# Altium schematic symbol library jlcpcb_2025_04_capacitors_extended_0402.schlib: 3594 symbols (part 6 of 20) (continued)
## C1005X5R0J225MTJ00F
designator C?  Capacitance: 2.2uF  (hidden comment: *)
Capacitor, Ceramic (MLCC), 2.2uF, ±20%, 6.3V, X5R, ±20%, SMD 0402; Manufacturer: TDK; Manufacturer Part Number: C1005X5R0J225MTJ00F; Package Size: 0402; JLCPCB Basic Part: No; JLCPCB Part Number: C343037; Supplier 1: LCSC; Category: Capacitors - MLCC; Supplier Part Number 1: C343037; Tolerance: ±20%; Voltage Rating: 6.3V; Temperature Coefficient: X5R; RoHS: Yes; ComponentLink1Description: Datasheet; ComponentLink1URL: https://wmsc.lcsc.com/wmsc/upload/file/pdf/v2/lcsc/2304140030_TDK-C1005X5R0J225MTJ00F_C343037.pdf; ComponentLink2Description: JLCPCB Part URL; ComponentLink2URL: https://jlcpcb.com/partdetail/C343037; ComponentLink3Description: LCSC Part URL; ComponentLink3URL: https://lcsc.com/product-detail/Multilayer-Ceramic-Capacitors-MLCC---SMD-SMT_TDK-TDK-C1005X5R0J225MTJ00F_C343037.html
footprint CAP-0402 (0402 (1005M) Capacitor)
pins: 1, 2

## C1005X5R0J335MTJ00E
designator C?  Capacitance: 3.3uF  (hidden comment: *)
Capacitor, Ceramic (MLCC), 3.3uF, ±20%, 6.3V, X5R, ±20%, SMD 0402; Manufacturer: TDK; Manufacturer Part Number: C1005X5R0J335MTJ00E; Package Size: 0402; JLCPCB Basic Part: No; JLCPCB Part Number: C694161; Supplier 1: LCSC; Category: Capacitors - MLCC; Supplier Part Number 1: C694161; Tolerance: ±20%; Voltage Rating: 6.3V; Temperature Coefficient: X5R; RoHS: Yes; ComponentLink1Description: Datasheet; ComponentLink1URL: https://wmsc.lcsc.com/wmsc/upload/file/pdf/v2/lcsc/2304140030_TDK-C1005X5R0J335MTJ00E_C694161.pdf; ComponentLink2Description: JLCPCB Part URL; ComponentLink2URL: https://jlcpcb.com/partdetail/C694161; ComponentLink3Description: LCSC Part URL; ComponentLink3URL: https://lcsc.com/product-detail/Multilayer-Ceramic-Capacitors-MLCC---SMD-SMT_TDK-TDK-C1005X5R0J335MTJ00E_C694161.html
footprint CAP-0402 (0402 (1005M) Capacitor)
pins: 1, 2

## C1005X5R0J475KTJ00F
designator C?  Capacitance: 4.7uF  (hidden comment: *)
Capacitor, Ceramic (MLCC), 4.7uF, ±10%, 6.3V, X5R, ±10%, SMD 0402; Manufacturer: TDK; Manufacturer Part Number: C1005X5R0J475KTJ00F; Package Size: 0402; JLCPCB Basic Part: No; JLCPCB Part Number: C342989; Supplier 1: LCSC; Category: Capacitors - MLCC; Supplier Part Number 1: C342989; Tolerance: ±10%; Voltage Rating: 6.3V; Temperature Coefficient: X5R; RoHS: Yes; ComponentLink1Description: Datasheet; ComponentLink1URL: https://wmsc.lcsc.com/wmsc/upload/file/pdf/v2/lcsc/2304140030_TDK-C1005X5R0J475KTJ00F_C342989.pdf; ComponentLink2Description: JLCPCB Part URL; ComponentLink2URL: https://jlcpcb.com/partdetail/C342989; ComponentLink3Description: LCSC Part URL; ComponentLink3URL: https://lcsc.com/product-detail/Multilayer-Ceramic-Capacitors-MLCC---SMD-SMT_TDK-TDK-C1005X5R0J475KTJ00F_C342989.html
footprint CAP-0402 (0402 (1005M) Capacitor)
pins: 1, 2

## C1005X5R0J475MTJ00E
designator C?  Capacitance: 4.7uF  (hidden comment: *)
Capacitor, Ceramic (MLCC), 4.7uF, ±20%, 6.3V, X5R, ±20%, SMD 0402; Manufacturer: TDK; Manufacturer Part Number: C1005X5R0J475MTJ00E; Package Size: 0402; JLCPCB Basic Part: No; JLCPCB Part Number: C23687; Supplier 1: LCSC; Category: Capacitors - MLCC; Supplier Part Number 1: C23687; Tolerance: ±20%; Voltage Rating: 6.3V; Temperature Coefficient: X5R; RoHS: Yes; ComponentLink1Description: Datasheet; ComponentLink1URL: https://wmsc.lcsc.com/wmsc/upload/file/pdf/v2/lcsc/1809051323_TDK-C1005X5R0J475MTJ00E_C23687.pdf; ComponentLink2Description: JLCPCB Part URL; ComponentLink2URL: https://jlcpcb.com/partdetail/C23687; ComponentLink3Description: LCSC Part URL; ComponentLink3URL: https://lcsc.com/product-detail/Multilayer-Ceramic-Capacitors-MLCC---SMD-SMT_TDK-TDK-C1005X5R0J475MTJ00E_C23687.html
footprint CAP-0402 (0402 (1005M) Capacitor)
pins: 1, 2

## C1005X5R1A105KTJ00F
designator C?  Capacitance: 1uF  (hidden comment: *)
Capacitor, Ceramic (MLCC), 1uF, ±10%, 10V, X5R, ±10%, SMD 0402; Manufacturer: TDK; Manufacturer Part Number: C1005X5R1A105KTJ00F; Package Size: 0402; JLCPCB Basic Part: No; JLCPCB Part Number: C694162; Supplier 1: LCSC; Category: Capacitors - MLCC; Supplier Part Number 1: C694162; Tolerance: ±10%; Voltage Rating: 10V; Temperature Coefficient: X5R; RoHS: Yes; ComponentLink1Description: Datasheet; ComponentLink1URL: https://wmsc.lcsc.com/wmsc/upload/file/pdf/v2/lcsc/2304140030_TDK-C1005X5R1A105KTJ00F_C694162.pdf; ComponentLink2Description: JLCPCB Part URL; ComponentLink2URL: https://jlcpcb.com/partdetail/C694162; ComponentLink3Description: LCSC Part URL; ComponentLink3URL: https://lcsc.com/product-detail/Multilayer-Ceramic-Capacitors-MLCC---SMD-SMT_TDK-TDK-C1005X5R1A105KTJ00F_C694162.html
footprint CAP-0402 (0402 (1005M) Capacitor)
pins: 1, 2

## C1005X5R1A225KT000E
designator C?  Capacitance: 2.2uF  (hidden comment: *)
Capacitor, Ceramic (MLCC), 2.2uF, ±10%, 10V, X5R, ±10%, SMD 0402; Manufacturer: TDK; Manufacturer Part Number: C1005X5R1A225KT000E; Package Size: 0402; JLCPCB Basic Part: No; JLCPCB Part Number: C76594; Supplier 1: LCSC; Category: Capacitors - MLCC; Supplier Part Number 1: C76594; Tolerance: ±10%; Voltage Rating: 10V; Temperature Coefficient: X5R; RoHS: Yes; ComponentLink1Description: Datasheet; ComponentLink1URL: https://wmsc.lcsc.com/wmsc/upload/file/pdf/v2/lcsc/2304140030_TDK-C1005X5R1A225KT000E_C76594.pdf; ComponentLink2Description: JLCPCB Part URL; ComponentLink2URL: https://jlcpcb.com/partdetail/C76594; ComponentLink3Description: LCSC Part URL; ComponentLink3URL: https://lcsc.com/product-detail/Multilayer-Ceramic-Capacitors-MLCC---SMD-SMT_TDK-TDK-C1005X5R1A225KT000E_C76594.html
footprint CAP-0402 (0402 (1005M) Capacitor)
pins: 1, 2

## C1005X5R1A225MT000E
designator C?  Capacitance: 2.2uF  (hidden comment: *)
Capacitor, Ceramic (MLCC), 2.2uF, ±20%, 10V, X5R, ±20%, SMD 0402; Manufacturer: TDK; Manufacturer Part Number: C1005X5R1A225MT000E; Package Size: 0402; JLCPCB Basic Part: No; JLCPCB Part Number: C343024; Supplier 1: LCSC; Category: Capacitors - MLCC; Supplier Part Number 1: C343024; Tolerance: ±20%; Voltage Rating: 10V; Temperature Coefficient: X5R; RoHS: Yes; ComponentLink1Description: Datasheet; ComponentLink1URL: https://wmsc.lcsc.com/wmsc/upload/file/pdf/v2/lcsc/2304140030_TDK-C1005X5R1A225MT000E_C343024.pdf; ComponentLink2Description: JLCPCB Part URL; ComponentLink2URL: https://jlcpcb.com/partdetail/C343024; ComponentLink3Description: LCSC Part URL; ComponentLink3URL: https://lcsc.com/product-detail/Multilayer-Ceramic-Capacitors-MLCC---SMD-SMT_TDK-TDK-C1005X5R1A225MT000E_C343024.html
footprint CAP-0402 (0402 (1005M) Capacitor)
pins: 1, 2

## C1005X5R1A335KTJ00E
designator C?  Capacitance: 3.3uF  (hidden comment: *)
Capacitor, Ceramic (MLCC), 3.3uF, ±10%, 10V, X5R, ±10%, SMD 0402; Manufacturer: TDK; Manufacturer Part Number: C1005X5R1A335KTJ00E; Package Size: 0402; JLCPCB Basic Part: No; JLCPCB Part Number: C695126; Supplier 1: LCSC; Category: Capacitors - MLCC; Supplier Part Number 1: C695126; Tolerance: ±10%; Voltage Rating: 10V; Temperature Coefficient: X5R; RoHS: Yes; ComponentLink1Description: Datasheet; ComponentLink1URL: https://wmsc.lcsc.com/wmsc/upload/file/pdf/v2/lcsc/2304140030_TDK-C1005X5R1A335KTJ00E_C695126.pdf; ComponentLink2Description: JLCPCB Part URL; ComponentLink2URL: https://jlcpcb.com/partdetail/C695126; ComponentLink3Description: LCSC Part URL; ComponentLink3URL: https://lcsc.com/product-detail/Multilayer-Ceramic-Capacitors-MLCC---SMD-SMT_TDK-TDK-C1005X5R1A335KTJ00E_C695126.html
footprint CAP-0402 (0402 (1005M) Capacitor)
pins: 1, 2

## C1005X5R1A475KTJ00E
designator C?  Capacitance: 4.7uF  (hidden comment: *)
Capacitor, Ceramic (MLCC), 4.7uF, ±10%, 10V, X5R, ±10%, SMD 0402; Manufacturer: TDK; Manufacturer Part Number: C1005X5R1A475KTJ00E; Package Size: 0402; JLCPCB Basic Part: No; JLCPCB Part Number: C342983; Supplier 1: LCSC; Category: Capacitors - MLCC; Supplier Part Number 1: C342983; Tolerance: ±10%; Voltage Rating: 10V; Temperature Coefficient: X5R; RoHS: Yes; ComponentLink1Description: Datasheet; ComponentLink1URL: https://wmsc.lcsc.com/wmsc/upload/file/pdf/v2/lcsc/2304140030_TDK-C1005X5R1A475KTJ00E_C342983.pdf; ComponentLink2Description: JLCPCB Part URL; ComponentLink2URL: https://jlcpcb.com/partdetail/C342983; ComponentLink3Description: LCSC Part URL; ComponentLink3URL: https://lcsc.com/product-detail/Multilayer-Ceramic-Capacitors-MLCC---SMD-SMT_TDK-TDK-C1005X5R1A475KTJ00E_C342983.html
footprint CAP-0402 (0402 (1005M) Capacitor)
pins: 1, 2

## C1005X5R1A475MTJ00E
designator C?  Capacitance: 4.7uF  (hidden comment: *)
Capacitor, Ceramic (MLCC), 4.7uF, ±20%, 10V, X5R, ±20%, SMD 0402; Manufacturer: TDK; Manufacturer Part Number: C1005X5R1A475MTJ00E; Package Size: 0402; JLCPCB Basic Part: No; JLCPCB Part Number: C342984; Supplier 1: LCSC; Category: Capacitors - MLCC; Supplier Part Number 1: C342984; Tolerance: ±20%; Voltage Rating: 10V; Temperature Coefficient: X5R; RoHS: Yes; ComponentLink1Description: Datasheet; ComponentLink1URL: https://wmsc.lcsc.com/wmsc/upload/file/pdf/v2/lcsc/2304140030_TDK-C1005X5R1A475MTJ00E_C342984.pdf; ComponentLink2Description: JLCPCB Part URL; ComponentLink2URL: https://jlcpcb.com/partdetail/C342984; ComponentLink3Description: LCSC Part URL; ComponentLink3URL: https://lcsc.com/product-detail/Multilayer-Ceramic-Capacitors-MLCC---SMD-SMT_TDK-TDK-C1005X5R1A475MTJ00E_C342984.html
footprint CAP-0402 (0402 (1005M) Capacitor)
pins: 1, 2

## C1005X5R1C104KT000F
designator C?  Capacitance: 100nF  (hidden comment: *)
Capacitor, Ceramic (MLCC), 100nF, ±10%, 16V, X5R, ±10%, SMD 0402; Manufacturer: TDK; Manufacturer Part Number: C1005X5R1C104KT000F; Package Size: 0402; JLCPCB Basic Part: No; JLCPCB Part Number: C338011; Supplier 1: LCSC; Category: Capacitors - MLCC; Supplier Part Number 1: C338011; Tolerance: ±10%; Voltage Rating: 16V; Temperature Coefficient: X5R; RoHS: Yes; ComponentLink1Description: Datasheet; ComponentLink1URL: https://wmsc.lcsc.com/wmsc/upload/file/pdf/v2/lcsc/2304140030_TDK-C1005X5R1C104KT000F_C338011.pdf; ComponentLink2Description: JLCPCB Part URL; ComponentLink2URL: https://jlcpcb.com/partdetail/C338011; ComponentLink3Description: LCSC Part URL; ComponentLink3URL: https://lcsc.com/product-detail/Multilayer-Ceramic-Capacitors-MLCC---SMD-SMT_TDK-TDK-C1005X5R1C104KT000F_C338011.html
footprint CAP-0402 (0402 (1005M) Capacitor)
pins: 1, 2

## C1005X5R1C224KT000F
designator C?  Capacitance: 220nF  (hidden comment: *)
Capacitor, Ceramic (MLCC), 220nF, ±10%, 16V, X5R, ±10%, SMD 0402; Manufacturer: TDK; Manufacturer Part Number: C1005X5R1C224KT000F; Package Size: 0402; JLCPCB Basic Part: No; JLCPCB Part Number: C445736; Supplier 1: LCSC; Category: Capacitors - MLCC; Supplier Part Number 1: C445736; Tolerance: ±10%; Voltage Rating: 16V; Temperature Coefficient: X5R; RoHS: Yes; ComponentLink1Description: Datasheet; ComponentLink1URL: https://wmsc.lcsc.com/wmsc/upload/file/pdf/v2/lcsc/2304140030_TDK-C1005X5R1C224KT000F_C445736.pdf; ComponentLink2Description: JLCPCB Part URL; ComponentLink2URL: https://jlcpcb.com/partdetail/C445736; ComponentLink3Description: LCSC Part URL; ComponentLink3URL: https://lcsc.com/product-detail/Multilayer-Ceramic-Capacitors-MLCC---SMD-SMT_TDK-TDK-C1005X5R1C224KT000F_C445736.html
footprint CAP-0402 (0402 (1005M) Capacitor)
pins: 1, 2

## C1005X5R1C225KT000E
designator C?  Capacitance: 2.2uF  (hidden comment: *)
Capacitor, Ceramic (MLCC), 2.2uF, ±10%, 16V, X5R, ±10%, SMD 0402; Manufacturer: TDK; Manufacturer Part Number: C1005X5R1C225KT000E; Package Size: 0402; JLCPCB Basic Part: No; JLCPCB Part Number: C342990; Supplier 1: LCSC; Category: Capacitors - MLCC; Supplier Part Number 1: C342990; Tolerance: ±10%; Voltage Rating: 16V; Temperature Coefficient: X5R; RoHS: Yes; ComponentLink1Description: Datasheet; ComponentLink1URL: https://wmsc.lcsc.com/wmsc/upload/file/pdf/v2/lcsc/2304140030_TDK-C1005X5R1C225KT000E_C342990.pdf; ComponentLink2Description: JLCPCB Part URL; ComponentLink2URL: https://jlcpcb.com/partdetail/C342990; ComponentLink3Description: LCSC Part URL; ComponentLink3URL: https://lcsc.com/product-detail/Multilayer-Ceramic-Capacitors-MLCC---SMD-SMT_TDK-TDK-C1005X5R1C225KT000E_C342990.html
footprint CAP-0402 (0402 (1005M) Capacitor)
pins: 1, 2

## C1005X5R1E104KT000E
designator C?  Capacitance: 100nF  (hidden comment: *)
Capacitor, Ceramic (MLCC), 100nF, ±10%, 25V, X5R, ±10%, SMD 0402; Manufacturer: TDK; Manufacturer Part Number: C1005X5R1E104KT000E; Package Size: 0402; JLCPCB Basic Part: No; JLCPCB Part Number: C361203; Supplier 1: LCSC; Category: Capacitors - MLCC; Supplier Part Number 1: C361203; Tolerance: ±10%; Voltage Rating: 25V; Temperature Coefficient: X5R; RoHS: Yes; ComponentLink1Description: Datasheet; ComponentLink1URL: https://wmsc.lcsc.com/wmsc/upload/file/pdf/v2/lcsc/2304140030_TDK-C1005X5R1E104KT000E_C361203.pdf; ComponentLink2Description: JLCPCB Part URL; ComponentLink2URL: https://jlcpcb.com/partdetail/C361203; ComponentLink3Description: LCSC Part URL; ComponentLink3URL: https://lcsc.com/product-detail/Multilayer-Ceramic-Capacitors-MLCC---SMD-SMT_TDK-TDK-C1005X5R1E104KT000E_C361203.html
footprint CAP-0402 (0402 (1005M) Capacitor)
pins: 1, 2

## C1005X5R1E105KT000E
designator C?  Capacitance: 1uF  (hidden comment: *)
Capacitor, Ceramic (MLCC), 1uF, ±10%, 25V, X5R, ±10%, SMD 0402; Manufacturer: TDK; Manufacturer Part Number: C1005X5R1E105KT000E; Package Size: 0402; JLCPCB Basic Part: No; JLCPCB Part Number: C191909; Supplier 1: LCSC; Category: Capacitors - MLCC; Supplier Part Number 1: C191909; Tolerance: ±10%; Voltage Rating: 25V; Temperature Coefficient: X5R; RoHS: Yes; ComponentLink1Description: Datasheet; ComponentLink1URL: https://wmsc.lcsc.com/wmsc/upload/file/pdf/v2/lcsc/2304140030_TDK-C1005X5R1E105KT000E_C191909.pdf; ComponentLink2Description: JLCPCB Part URL; ComponentLink2URL: https://jlcpcb.com/partdetail/C191909; ComponentLink3Description: LCSC Part URL; ComponentLink3URL: https://lcsc.com/product-detail/Multilayer-Ceramic-Capacitors-MLCC---SMD-SMT_TDK-TDK-C1005X5R1E105KT000E_C191909.html
footprint CAP-0402 (0402 (1005M) Capacitor)
pins: 1, 2

## C1005X5R1E224KT000E
designator C?  Capacitance: 220nF  (hidden comment: *)
Capacitor, Ceramic (MLCC), 220nF, ±10%, 25V, X5R, ±10%, SMD 0402; Manufacturer: TDK; Manufacturer Part Number: C1005X5R1E224KT000E; Package Size: 0402; JLCPCB Basic Part: No; JLCPCB Part Number: C361196; Supplier 1: LCSC; Category: Capacitors - MLCC; Supplier Part Number 1: C361196; Tolerance: ±10%; Voltage Rating: 25V; Temperature Coefficient: X5R; RoHS: Yes; ComponentLink1Description: Datasheet; ComponentLink1URL: https://wmsc.lcsc.com/wmsc/upload/file/pdf/v2/lcsc/2304140030_TDK-C1005X5R1E224KT000E_C361196.pdf; ComponentLink2Description: JLCPCB Part URL; ComponentLink2URL: https://jlcpcb.com/partdetail/C361196; ComponentLink3Description: LCSC Part URL; ComponentLink3URL: https://lcsc.com/product-detail/Multilayer-Ceramic-Capacitors-MLCC---SMD-SMT_TDK-TDK-C1005X5R1E224KT000E_C361196.html
footprint CAP-0402 (0402 (1005M) Capacitor)
pins: 1, 2

## C1005X5R1E225KT000E
designator C?  Capacitance: 2.2uF  (hidden comment: *)
Capacitor, Ceramic (MLCC), 2.2uF, ±10%, 25V, X5R, ±10%, SMD 0402; Manufacturer: TDK; Manufacturer Part Number: C1005X5R1E225KT000E; Package Size: 0402; JLCPCB Basic Part: No; JLCPCB Part Number: C76595; Supplier 1: LCSC; Category: Capacitors - MLCC; Supplier Part Number 1: C76595; Tolerance: ±10%; Voltage Rating: 25V; Temperature Coefficient: X5R; RoHS: Yes; ComponentLink1Description: Datasheet; ComponentLink1URL: https://wmsc.lcsc.com/wmsc/upload/file/pdf/v2/lcsc/2304140030_TDK-C1005X5R1E225KT000E_C76595.pdf; ComponentLink2Description: JLCPCB Part URL; ComponentLink2URL: https://jlcpcb.com/partdetail/C76595; ComponentLink3Description: LCSC Part URL; ComponentLink3URL: https://lcsc.com/product-detail/Multilayer-Ceramic-Capacitors-MLCC---SMD-SMT_TDK-TDK-C1005X5R1E225KT000E_C76595.html
footprint CAP-0402 (0402 (1005M) Capacitor)
pins: 1, 2

## C1005X5R1E225MT000E
designator C?  Capacitance: 2.2uF  (hidden comment: *)
Capacitor, Ceramic (MLCC), 2.2uF, ±20%, 25V, X5R, ±20%, SMD 0402; Manufacturer: TDK; Manufacturer Part Number: C1005X5R1E225MT000E; Package Size: 0402; JLCPCB Basic Part: No; JLCPCB Part Number: C445727; Supplier 1: LCSC; Category: Capacitors - MLCC; Supplier Part Number 1: C445727; Tolerance: ±20%; Voltage Rating: 25V; Temperature Coefficient: X5R; RoHS: Yes; ComponentLink1Description: Datasheet; ComponentLink1URL: https://wmsc.lcsc.com/wmsc/upload/file/pdf/v2/lcsc/2304140030_TDK-C1005X5R1E225MT000E_C445727.pdf; ComponentLink2Description: JLCPCB Part URL; ComponentLink2URL: https://jlcpcb.com/partdetail/C445727; ComponentLink3Description: LCSC Part URL; ComponentLink3URL: https://lcsc.com/product-detail/Multilayer-Ceramic-Capacitors-MLCC---SMD-SMT_TDK-TDK-C1005X5R1E225MT000E_C445727.html
footprint CAP-0402 (0402 (1005M) Capacitor)
pins: 1, 2

## C1005X5R1E474KTK00F
designator C?  Capacitance: 470nF  (hidden comment: *)
Capacitor, Ceramic (MLCC), 470nF, ±10%, 25V, X5R, ±10%, SMD 0402; Manufacturer: TDK; Manufacturer Part Number: C1005X5R1E474KTK00F; Package Size: 0402; JLCPCB Basic Part: No; JLCPCB Part Number: C694271; Supplier 1: LCSC; Category: Capacitors - MLCC; Supplier Part Number 1: C694271; Tolerance: ±10%; Voltage Rating: 25V; Temperature Coefficient: X5R; RoHS: Yes; ComponentLink1Description: Datasheet; ComponentLink1URL: https://wmsc.lcsc.com/wmsc/upload/file/pdf/v2/lcsc/2304140030_TDK-C1005X5R1E474KTK00F_C694271.pdf; ComponentLink2Description: JLCPCB Part URL; ComponentLink2URL: https://jlcpcb.com/partdetail/C694271; ComponentLink3Description: LCSC Part URL; ComponentLink3URL: https://lcsc.com/product-detail/Multilayer-Ceramic-Capacitors-MLCC---SMD-SMT_TDK-TDK-C1005X5R1E474KTK00F_C694271.html
footprint CAP-0402 (0402 (1005M) Capacitor)
pins: 1, 2

## C1005X5R1E474MTK00F
designator C?  Capacitance: 470nF  (hidden comment: *)
Capacitor, Ceramic (MLCC), 470nF, ±20%, 25V, X5R, ±20%, SMD 0402; Manufacturer: TDK; Manufacturer Part Number: C1005X5R1E474MTK00F; Package Size: 0402; JLCPCB Basic Part: No; JLCPCB Part Number: C191908; Supplier 1: LCSC; Category: Capacitors - MLCC; Supplier Part Number 1: C191908; Tolerance: ±20%; Voltage Rating: 25V; Temperature Coefficient: X5R; RoHS: Yes; ComponentLink1Description: Datasheet; ComponentLink1URL: https://wmsc.lcsc.com/wmsc/upload/file/pdf/v2/lcsc/2304140030_TDK-C1005X5R1E474MTK00F_C191908.pdf; ComponentLink2Description: JLCPCB Part URL; ComponentLink2URL: https://jlcpcb.com/partdetail/C191908; ComponentLink3Description: LCSC Part URL; ComponentLink3URL: https://lcsc.com/product-detail/Multilayer-Ceramic-Capacitors-MLCC---SMD-SMT_TDK-TDK-C1005X5R1E474MTK00F_C191908.html
footprint CAP-0402 (0402 (1005M) Capacitor)
pins: 1, 2

## C1005X5R1H104KT000F
designator C?  Capacitance: 100nF  (hidden comment: *)
Capacitor, Ceramic (MLCC), 100nF, ±10%, 50V, X5R, ±10%, SMD 0402; Manufacturer: TDK; Manufacturer Part Number: C1005X5R1H104KT000F; Package Size: 0402; JLCPCB Basic Part: No; JLCPCB Part Number: C361202; Supplier 1: LCSC; Category: Capacitors - MLCC; Supplier Part Number 1: C361202; Tolerance: ±10%; Voltage Rating: 50V; Temperature Coefficient: X5R; RoHS: Yes; ComponentLink1Description: Datasheet; ComponentLink1URL: https://wmsc.lcsc.com/wmsc/upload/file/pdf/v2/lcsc/1912111437_TDK-C1005X5R1H104KT000F_C361202.pdf; ComponentLink2Description: JLCPCB Part URL; ComponentLink2URL: https://jlcpcb.com/partdetail/C361202; ComponentLink3Description: LCSC Part URL; ComponentLink3URL: https://lcsc.com/product-detail/Multilayer-Ceramic-Capacitors-MLCC---SMD-SMT_TDK-TDK-C1005X5R1H104KT000F_C361202.html
footprint CAP-0402 (0402 (1005M) Capacitor)
pins: 1, 2

## C1005X5R1H222KT000F
designator C?  Capacitance: 2.2nF  (hidden comment: *)
Capacitor, Ceramic (MLCC), 2.2nF, ±10%, 50V, X5R, ±10%, SMD 0402; Manufacturer: TDK; Manufacturer Part Number: C1005X5R1H222KT000F; Package Size: 0402; JLCPCB Basic Part: No; JLCPCB Part Number: C694165; Supplier 1: LCSC; Category: Capacitors - MLCC; Supplier Part Number 1: C694165; Tolerance: ±10%; Voltage Rating: 50V; Temperature Coefficient: X5R; RoHS: Yes; ComponentLink1Description: Datasheet; ComponentLink1URL: https://wmsc.lcsc.com/wmsc/upload/file/pdf/v2/lcsc/2304140030_TDK-C1005X5R1H222KT000F_C694165.pdf; ComponentLink2Description: JLCPCB Part URL; ComponentLink2URL: https://jlcpcb.com/partdetail/C694165; ComponentLink3Description: LCSC Part URL; ComponentLink3URL: https://lcsc.com/product-detail/Multilayer-Ceramic-Capacitors-MLCC---SMD-SMT_TDK-TDK-C1005X5R1H222KT000F_C694165.html
footprint CAP-0402 (0402 (1005M) Capacitor)
pins: 1, 2

## C1005X5R1V105KT000E
designator C?  Capacitance: 1uF  (hidden comment: *)
Capacitor, Ceramic (MLCC), 1uF, ±10%, 35V, X5R, ±10%, SMD 0402; Manufacturer: TDK; Manufacturer Part Number: C1005X5R1V105KT000E; Package Size: 0402; JLCPCB Basic Part: No; JLCPCB Part Number: C694272; Supplier 1: LCSC; Category: Capacitors - MLCC; Supplier Part Number 1: C694272; Tolerance: ±10%; Voltage Rating: 35V; Temperature Coefficient: X5R; RoHS: Yes; ComponentLink1Description: Datasheet; ComponentLink1URL: https://wmsc.lcsc.com/wmsc/upload/file/pdf/v2/lcsc/2304140030_TDK-C1005X5R1V105KT000E_C694272.pdf; ComponentLink2Description: JLCPCB Part URL; ComponentLink2URL: https://jlcpcb.com/partdetail/C694272; ComponentLink3Description: LCSC Part URL; ComponentLink3URL: https://lcsc.com/product-detail/Multilayer-Ceramic-Capacitors-MLCC---SMD-SMT_TDK-TDK-C1005X5R1V105KT000E_C694272.html
footprint CAP-0402 (0402 (1005M) Capacitor)
pins: 1, 2

## C1005X5R1V225KT000E
designator C?  Capacitance: 2.2uF  (hidden comment: *)
Capacitor, Ceramic (MLCC), 2.2uF, ±10%, 35V, X5R, ±10%, SMD 0402; Manufacturer: TDK; Manufacturer Part Number: C1005X5R1V225KT000E; Package Size: 0402; JLCPCB Basic Part: No; JLCPCB Part Number: C342966; Supplier 1: LCSC; Category: Capacitors - MLCC; Supplier Part Number 1: C342966; Tolerance: ±10%; Voltage Rating: 35V; Temperature Coefficient: X5R; RoHS: Yes; ComponentLink1Description: Datasheet; ComponentLink1URL: https://wmsc.lcsc.com/wmsc/upload/file/pdf/v2/lcsc/2304140030_TDK-C1005X5R1V225KT000E_C342966.pdf; ComponentLink2Description: JLCPCB Part URL; ComponentLink2URL: https://jlcpcb.com/partdetail/C342966; ComponentLink3Description: LCSC Part URL; ComponentLink3URL: https://lcsc.com/product-detail/Multilayer-Ceramic-Capacitors-MLCC---SMD-SMT_TDK-TDK-C1005X5R1V225KT000E_C342966.html
footprint CAP-0402 (0402 (1005M) Capacitor)
pins: 1, 2

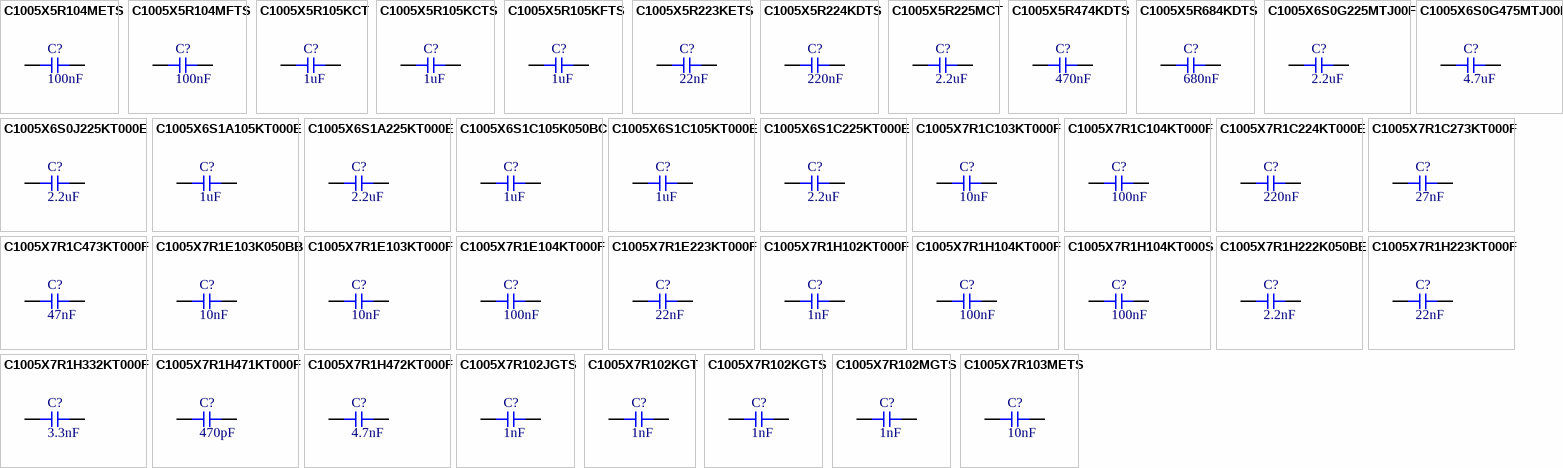
[diagram p27: symbols C1005X5R104METS to C1005X7R103METS]

## C1005X5R104METS
designator C?  Capacitance: 100nF  (hidden comment: *)
Capacitor, Ceramic (MLCC), 100nF, ±20%, 16V, X5R, ±20%, SMD 0402; Manufacturer: Darfon Elec; Manufacturer Part Number: C1005X5R104METS; Package Size: 0402; JLCPCB Basic Part: No; JLCPCB Part Number: C147680; Supplier 1: LCSC; Category: Capacitors - MLCC; Supplier Part Number 1: C147680; Tolerance: ±20%; Voltage Rating: 16V; Temperature Coefficient: X5R; RoHS: Yes; ComponentLink1Description: Datasheet; ComponentLink1URL: https://wmsc.lcsc.com/wmsc/upload/file/pdf/v2/lcsc/2304140030_Darfon-Elec-C1005X5R104METS_C147680.pdf; ComponentLink2Description: JLCPCB Part URL; ComponentLink2URL: https://jlcpcb.com/partdetail/C147680; ComponentLink3Description: LCSC Part URL; ComponentLink3URL: https://lcsc.com/product-detail/Multilayer-Ceramic-Capacitors-MLCC---SMD-SMT_Darfon-Elec-Darfon-Elec-C1005X5R104METS_C147680.html
footprint CAP-0402 (0402 (1005M) Capacitor)
pins: 1, 2

## C1005X5R104MFTS
designator C?  Capacitance: 100nF  (hidden comment: *)
Capacitor, Ceramic (MLCC), 100nF, ±20%, 25V, X5R, ±20%, SMD 0402; Manufacturer: Darfon Elec; Manufacturer Part Number: C1005X5R104MFTS; Package Size: 0402; JLCPCB Basic Part: No; JLCPCB Part Number: C147679; Supplier 1: LCSC; Category: Capacitors - MLCC; Supplier Part Number 1: C147679; Tolerance: ±20%; Voltage Rating: 25V; Temperature Coefficient: X5R; RoHS: Yes; ComponentLink1Description: Datasheet; ComponentLink1URL: https://wmsc.lcsc.com/wmsc/upload/file/pdf/v2/lcsc/2304140030_Darfon-Elec-C1005X5R104MFTS_C147679.pdf; ComponentLink2Description: JLCPCB Part URL; ComponentLink2URL: https://jlcpcb.com/partdetail/C147679; ComponentLink3Description: LCSC Part URL; ComponentLink3URL: https://lcsc.com/product-detail/Multilayer-Ceramic-Capacitors-MLCC---SMD-SMT_Darfon-Elec-Darfon-Elec-C1005X5R104MFTS_C147679.html
footprint CAP-0402 (0402 (1005M) Capacitor)
pins: 1, 2

## C1005X5R105KCT
designator C?  Capacitance: 1uF  (hidden comment: *)
Capacitor, Ceramic (MLCC), 1uF, ±10%, 6.3V, X5R, ±10%, SMD 0402; Manufacturer: Darfon Elec; Manufacturer Part Number: C1005X5R105KCT; Package Size: 0402; JLCPCB Basic Part: No; JLCPCB Part Number: C258509; Supplier 1: LCSC; Category: Capacitors - MLCC; Supplier Part Number 1: C258509; Tolerance: ±10%; Voltage Rating: 6.3V; Temperature Coefficient: X5R; RoHS: Yes; ComponentLink1Description: Datasheet; ComponentLink1URL: https://wmsc.lcsc.com/wmsc/upload/file/pdf/v2/lcsc/2304140030_Darfon-Elec-C1005X5R105KCT_C258509.pdf; ComponentLink2Description: JLCPCB Part URL; ComponentLink2URL: https://jlcpcb.com/partdetail/C258509; ComponentLink3Description: LCSC Part URL; ComponentLink3URL: https://lcsc.com/product-detail/Multilayer-Ceramic-Capacitors-MLCC---SMD-SMT_Darfon-Elec-Darfon-Elec-C1005X5R105KCT_C258509.html
footprint CAP-0402 (0402 (1005M) Capacitor)
pins: 1, 2

## C1005X5R105KCTS
designator C?  Capacitance: 1uF  (hidden comment: *)
Capacitor, Ceramic (MLCC), 1uF, ±10%, 6.3V, X5R, ±10%, SMD 0402; Manufacturer: Darfon Elec; Manufacturer Part Number: C1005X5R105KCTS; Package Size: 0402; JLCPCB Basic Part: No; JLCPCB Part Number: C415694; Supplier 1: LCSC; Category: Capacitors - MLCC; Supplier Part Number 1: C415694; Tolerance: ±10%; Voltage Rating: 6.3V; Temperature Coefficient: X5R; RoHS: Yes; ComponentLink1Description: Datasheet; ComponentLink1URL: https://wmsc.lcsc.com/wmsc/upload/file/pdf/v2/lcsc/2304140030_Darfon-Elec-C1005X5R105KCTS_C415694.pdf; ComponentLink2Description: JLCPCB Part URL; ComponentLink2URL: https://jlcpcb.com/partdetail/C415694; ComponentLink3Description: LCSC Part URL; ComponentLink3URL: https://lcsc.com/product-detail/Multilayer-Ceramic-Capacitors-MLCC---SMD-SMT_Darfon-Elec-Darfon-Elec-C1005X5R105KCTS_C415694.html
footprint CAP-0402 (0402 (1005M) Capacitor)
pins: 1, 2

## C1005X5R105KFTS
designator C?  Capacitance: 1uF  (hidden comment: *)
Capacitor, Ceramic (MLCC), 1uF, 25V, X5R, SMD 0402; Manufacturer: Darfon Elec; Manufacturer Part Number: C1005X5R105KFTS; Package Size: 0402; JLCPCB Basic Part: No; JLCPCB Part Number: C2987829; Supplier 1: LCSC; Category: Capacitors - MLCC; Supplier Part Number 1: C2987829; Voltage Rating: 25V; Temperature Coefficient: X5R; RoHS: Yes; ComponentLink1Description: Datasheet; ComponentLink1URL: https://wmsc.lcsc.com/wmsc/upload/file/pdf/v2/lcsc/2204011630_Darfon-Elec-C1005X5R105KFTS_C2987829.pdf; ComponentLink2Description: JLCPCB Part URL; ComponentLink2URL: https://jlcpcb.com/partdetail/C2987829; ComponentLink3Description: LCSC Part URL; ComponentLink3URL: https://lcsc.com/product-detail/Multilayer-Ceramic-Capacitors-MLCC---SMD-SMT_Darfon-Elec-Darfon-Elec-C1005X5R105KFTS_C2987829.html
footprint CAP-0402 (0402 (1005M) Capacitor)
pins: 1, 2

## C1005X5R223KETS
designator C?  Capacitance: 22nF  (hidden comment: *)
Capacitor, Ceramic (MLCC), 22nF, ±10%, 16V, X5R, ±10%, SMD 0402; Manufacturer: Darfon Elec; Manufacturer Part Number: C1005X5R223KETS; Package Size: 0402; JLCPCB Basic Part: No; JLCPCB Part Number: C147651; Supplier 1: LCSC; Category: Capacitors - MLCC; Supplier Part Number 1: C147651; Tolerance: ±10%; Voltage Rating: 16V; Temperature Coefficient: X5R; RoHS: Yes; ComponentLink1Description: Datasheet; ComponentLink1URL: https://wmsc.lcsc.com/wmsc/upload/file/pdf/v2/lcsc/1810240911_Darfon-Elec-C1005X5R223KETS_C147651.pdf; ComponentLink2Description: JLCPCB Part URL; ComponentLink2URL: https://jlcpcb.com/partdetail/C147651; ComponentLink3Description: LCSC Part URL; ComponentLink3URL: https://lcsc.com/product-detail/Multilayer-Ceramic-Capacitors-MLCC---SMD-SMT_Darfon-Elec-Darfon-Elec-C1005X5R223KETS_C147651.html
footprint CAP-0402 (0402 (1005M) Capacitor)
pins: 1, 2

## C1005X5R224KDTS
designator C?  Capacitance: 220nF  (hidden comment: *)
Capacitor, Ceramic (MLCC), 220nF, ±10%, 10V, X5R, ±10%, SMD 0402; Manufacturer: Darfon Elec; Manufacturer Part Number: C1005X5R224KDTS; Package Size: 0402; JLCPCB Basic Part: No; JLCPCB Part Number: C147700; Supplier 1: LCSC; Category: Capacitors - MLCC; Supplier Part Number 1: C147700; Tolerance: ±10%; Voltage Rating: 10V; Temperature Coefficient: X5R; RoHS: Yes; ComponentLink1Description: Datasheet; ComponentLink1URL: https://wmsc.lcsc.com/wmsc/upload/file/pdf/v2/lcsc/2304140030_Darfon-Elec-C1005X5R224KDTS_C147700.pdf; ComponentLink2Description: JLCPCB Part URL; ComponentLink2URL: https://jlcpcb.com/partdetail/C147700; ComponentLink3Description: LCSC Part URL; ComponentLink3URL: https://lcsc.com/product-detail/Multilayer-Ceramic-Capacitors-MLCC---SMD-SMT_Darfon-Elec-Darfon-Elec-C1005X5R224KDTS_C147700.html
footprint CAP-0402 (0402 (1005M) Capacitor)
pins: 1, 2

## C1005X5R225MCT
designator C?  Capacitance: 2.2uF  (hidden comment: *)
Capacitor, Ceramic (MLCC), 2.2uF, ±20%, 6.3V, X5R, ±20%, SMD 0402; Manufacturer: Darfon Elec; Manufacturer Part Number: C1005X5R225MCT; Package Size: 0402; JLCPCB Basic Part: No; JLCPCB Part Number: C147739; Supplier 1: LCSC; Category: Capacitors - MLCC; Supplier Part Number 1: C147739; Tolerance: ±20%; Voltage Rating: 6.3V; Temperature Coefficient: X5R; RoHS: Yes; ComponentLink1Description: Datasheet; ComponentLink1URL: https://wmsc.lcsc.com/wmsc/upload/file/pdf/v2/lcsc/2304140030_Darfon-Elec-C1005X5R225MCT_C147739.pdf; ComponentLink2Description: JLCPCB Part URL; ComponentLink2URL: https://jlcpcb.com/partdetail/C147739; ComponentLink3Description: LCSC Part URL; ComponentLink3URL: https://lcsc.com/product-detail/Multilayer-Ceramic-Capacitors-MLCC---SMD-SMT_Darfon-Elec-Darfon-Elec-C1005X5R225MCT_C147739.html
footprint CAP-0402 (0402 (1005M) Capacitor)
pins: 1, 2

## C1005X5R474KDTS
designator C?  Capacitance: 470nF  (hidden comment: *)
Capacitor, Ceramic (MLCC), 470nF, ±10%, 10V, X5R, ±10%, SMD 0402; Manufacturer: Darfon Elec; Manufacturer Part Number: C1005X5R474KDTS; Package Size: 0402; JLCPCB Basic Part: No; JLCPCB Part Number: C147712; Supplier 1: LCSC; Category: Capacitors - MLCC; Supplier Part Number 1: C147712; Tolerance: ±10%; Voltage Rating: 10V; Temperature Coefficient: X5R; RoHS: Yes; ComponentLink1Description: Datasheet; ComponentLink1URL: https://wmsc.lcsc.com/wmsc/upload/file/pdf/v2/lcsc/2304140030_Darfon-Elec-C1005X5R474KDTS_C147712.pdf; ComponentLink2Description: JLCPCB Part URL; ComponentLink2URL: https://jlcpcb.com/partdetail/C147712; ComponentLink3Description: LCSC Part URL; ComponentLink3URL: https://lcsc.com/product-detail/Multilayer-Ceramic-Capacitors-MLCC---SMD-SMT_Darfon-Elec-Darfon-Elec-C1005X5R474KDTS_C147712.html
footprint CAP-0402 (0402 (1005M) Capacitor)
pins: 1, 2

## C1005X5R684KDTS
designator C?  Capacitance: 680nF  (hidden comment: *)
Capacitor, Ceramic (MLCC), 680nF, ±10%, 10V, X5R, ±10%, SMD 0402; Manufacturer: Darfon Elec; Manufacturer Part Number: C1005X5R684KDTS; Package Size: 0402; JLCPCB Basic Part: No; JLCPCB Part Number: C513753; Supplier 1: LCSC; Category: Capacitors - MLCC; Supplier Part Number 1: C513753; Tolerance: ±10%; Voltage Rating: 10V; Temperature Coefficient: X5R; RoHS: Yes; ComponentLink1Description: Datasheet; ComponentLink1URL: https://wmsc.lcsc.com/wmsc/upload/file/pdf/v2/lcsc/2304140030_Darfon-Elec-C1005X5R684KDTS_C513753.pdf; ComponentLink2Description: JLCPCB Part URL; ComponentLink2URL: https://jlcpcb.com/partdetail/C513753; ComponentLink3Description: LCSC Part URL; ComponentLink3URL: https://lcsc.com/product-detail/Multilayer-Ceramic-Capacitors-MLCC---SMD-SMT_Darfon-Elec-Darfon-Elec-C1005X5R684KDTS_C513753.html
footprint CAP-0402 (0402 (1005M) Capacitor)
pins: 1, 2

## C1005X6S0G225MTJ00F
designator C?  Capacitance: 2.2uF  (hidden comment: *)
Capacitor, Ceramic (MLCC), 2.2uF, ±20%, 4V, X6S, ±20%, SMD 0402; Manufacturer: TDK; Manufacturer Part Number: C1005X6S0G225MTJ00F; Package Size: 0402; JLCPCB Basic Part: No; JLCPCB Part Number: C343040; Supplier 1: LCSC; Category: Capacitors - MLCC; Supplier Part Number 1: C343040; Tolerance: ±20%; Voltage Rating: 4V; Temperature Coefficient: X6S; RoHS: Yes; ComponentLink1Description: Datasheet; ComponentLink1URL: https://wmsc.lcsc.com/wmsc/upload/file/pdf/v2/lcsc/2304140030_TDK-C1005X6S0G225MTJ00F_C343040.pdf; ComponentLink2Description: JLCPCB Part URL; ComponentLink2URL: https://jlcpcb.com/partdetail/C343040; ComponentLink3Description: LCSC Part URL; ComponentLink3URL: https://lcsc.com/product-detail/Multilayer-Ceramic-Capacitors-MLCC---SMD-SMT_TDK-TDK-C1005X6S0G225MTJ00F_C343040.html
footprint CAP-0402 (0402 (1005M) Capacitor)
pins: 1, 2

## C1005X6S0G475MTJ00E
designator C?  Capacitance: 4.7uF  (hidden comment: *)
Capacitor, Ceramic (MLCC), 4.7uF, ±20%, 4V, X6S, ±20%, SMD 0402; Manufacturer: TDK; Manufacturer Part Number: C1005X6S0G475MTJ00E; Package Size: 0402; JLCPCB Basic Part: No; JLCPCB Part Number: C342992; Supplier 1: LCSC; Category: Capacitors - MLCC; Supplier Part Number 1: C342992; Tolerance: ±20%; Voltage Rating: 4V; Temperature Coefficient: X6S; RoHS: Yes; ComponentLink1Description: Datasheet; ComponentLink1URL: https://wmsc.lcsc.com/wmsc/upload/file/pdf/v2/lcsc/2304140030_TDK-C1005X6S0G475MTJ00E_C342992.pdf; ComponentLink2Description: JLCPCB Part URL; ComponentLink2URL: https://jlcpcb.com/partdetail/C342992; ComponentLink3Description: LCSC Part URL; ComponentLink3URL: https://lcsc.com/product-detail/Multilayer-Ceramic-Capacitors-MLCC---SMD-SMT_TDK-TDK-C1005X6S0G475MTJ00E_C342992.html
footprint CAP-0402 (0402 (1005M) Capacitor)
pins: 1, 2

## C1005X6S0J225KT000E
designator C?  Capacitance: 2.2uF  (hidden comment: *)
Capacitor, Ceramic (MLCC), 2.2uF, ±10%, 6.3V, X6S, ±10%, SMD 0402; Manufacturer: TDK; Manufacturer Part Number: C1005X6S0J225KT000E; Package Size: 0402; JLCPCB Basic Part: No; JLCPCB Part Number: C694168; Supplier 1: LCSC; Category: Capacitors - MLCC; Supplier Part Number 1: C694168; Tolerance: ±10%; Voltage Rating: 6.3V; Temperature Coefficient: X6S; RoHS: Yes; ComponentLink1Description: Datasheet; ComponentLink1URL: https://wmsc.lcsc.com/wmsc/upload/file/pdf/v2/lcsc/2304140030_TDK-C1005X6S0J225KT000E_C694168.pdf; ComponentLink2Description: JLCPCB Part URL; ComponentLink2URL: https://jlcpcb.com/partdetail/C694168; ComponentLink3Description: LCSC Part URL; ComponentLink3URL: https://lcsc.com/product-detail/Multilayer-Ceramic-Capacitors-MLCC---SMD-SMT_TDK-TDK-C1005X6S0J225KT000E_C694168.html
footprint CAP-0402 (0402 (1005M) Capacitor)
pins: 1, 2

## C1005X6S1A105KT000E
designator C?  Capacitance: 1uF  (hidden comment: *)
Capacitor, Ceramic (MLCC), 1uF, ±10%, 10V, X6S, ±10%, SMD 0402; Manufacturer: TDK; Manufacturer Part Number: C1005X6S1A105KT000E; Package Size: 0402; JLCPCB Basic Part: No; JLCPCB Part Number: C694169; Supplier 1: LCSC; Category: Capacitors - MLCC; Supplier Part Number 1: C694169; Tolerance: ±10%; Voltage Rating: 10V; Temperature Coefficient: X6S; RoHS: Yes; ComponentLink1Description: Datasheet; ComponentLink1URL: https://wmsc.lcsc.com/wmsc/upload/file/pdf/v2/lcsc/2304140030_TDK-C1005X6S1A105KT000E_C694169.pdf; ComponentLink2Description: JLCPCB Part URL; ComponentLink2URL: https://jlcpcb.com/partdetail/C694169; ComponentLink3Description: LCSC Part URL; ComponentLink3URL: https://lcsc.com/product-detail/Multilayer-Ceramic-Capacitors-MLCC---SMD-SMT_TDK-TDK-C1005X6S1A105KT000E_C694169.html
footprint CAP-0402 (0402 (1005M) Capacitor)
pins: 1, 2

## C1005X6S1A225KT000E
designator C?  Capacitance: 2.2uF  (hidden comment: *)
Capacitor, Ceramic (MLCC), 2.2uF, ±10%, 10V, X6S, ±10%, SMD 0402; Manufacturer: TDK; Manufacturer Part Number: C1005X6S1A225KT000E; Package Size: 0402; JLCPCB Basic Part: No; JLCPCB Part Number: C695358; Supplier 1: LCSC; Category: Capacitors - MLCC; Supplier Part Number 1: C695358; Tolerance: ±10%; Voltage Rating: 10V; Temperature Coefficient: X6S; RoHS: Yes; ComponentLink1Description: Datasheet; ComponentLink1URL: https://wmsc.lcsc.com/wmsc/upload/file/pdf/v2/lcsc/2304140030_TDK-C1005X6S1A225KT000E_C695358.pdf; ComponentLink2Description: JLCPCB Part URL; ComponentLink2URL: https://jlcpcb.com/partdetail/C695358; ComponentLink3Description: LCSC Part URL; ComponentLink3URL: https://lcsc.com/product-detail/Multilayer-Ceramic-Capacitors-MLCC---SMD-SMT_TDK-TDK-C1005X6S1A225KT000E_C695358.html
footprint CAP-0402 (0402 (1005M) Capacitor)
pins: 1, 2

## C1005X6S1C105K050BC
designator C?  Capacitance: 1uF  (hidden comment: *)
Capacitor, Ceramic (MLCC), 1uF, ±10%, 16V, X6S, ±10%, SMD 0402; Manufacturer: TDK; Manufacturer Part Number: C1005X6S1C105K050BC; Package Size: 0402; JLCPCB Basic Part: No; JLCPCB Part Number: C2167412; Supplier 1: LCSC; Category: Capacitors - MLCC; Supplier Part Number 1: C2167412; Tolerance: ±10%; Voltage Rating: 16V; Temperature Coefficient: X6S; RoHS: Yes; ComponentLink1Description: Datasheet; ComponentLink1URL: https://wmsc.lcsc.com/wmsc/upload/file/pdf/v2/lcsc/2304140030_TDK-C1005X6S1C105K050BC_C2167412.pdf; ComponentLink2Description: JLCPCB Part URL; ComponentLink2URL: https://jlcpcb.com/partdetail/C2167412; ComponentLink3Description: LCSC Part URL; ComponentLink3URL: https://lcsc.com/product-detail/Multilayer-Ceramic-Capacitors-MLCC---SMD-SMT_TDK-TDK-C1005X6S1C105K050BC_C2167412.html
footprint CAP-0402 (0402 (1005M) Capacitor)
pins: 1, 2

## C1005X6S1C105KT000E
designator C?  Capacitance: 1uF  (hidden comment: *)
Capacitor, Ceramic (MLCC), 1uF, ±10%, 16V, X6S, ±10%, SMD 0402; Manufacturer: TDK; Manufacturer Part Number: C1005X6S1C105KT000E; Package Size: 0402; JLCPCB Basic Part: No; JLCPCB Part Number: C393026; Supplier 1: LCSC; Category: Capacitors - MLCC; Supplier Part Number 1: C393026; Tolerance: ±10%; Voltage Rating: 16V; Temperature Coefficient: X6S; RoHS: Yes; ComponentLink1Description: Datasheet; ComponentLink1URL: https://wmsc.lcsc.com/wmsc/upload/file/pdf/v2/lcsc/1912111437_TDK-C1005X6S1C105KT000E_C393026.pdf; ComponentLink2Description: JLCPCB Part URL; ComponentLink2URL: https://jlcpcb.com/partdetail/C393026; ComponentLink3Description: LCSC Part URL; ComponentLink3URL: https://lcsc.com/product-detail/Multilayer-Ceramic-Capacitors-MLCC---SMD-SMT_TDK-TDK-C1005X6S1C105KT000E_C393026.html
footprint CAP-0402 (0402 (1005M) Capacitor)
pins: 1, 2

## C1005X6S1C225KT000E
designator C?  Capacitance: 2.2uF  (hidden comment: *)
Capacitor, Ceramic (MLCC), 2.2uF, ±10%, 16V, X6S, ±10%, SMD 0402; Manufacturer: TDK; Manufacturer Part Number: C1005X6S1C225KT000E; Package Size: 0402; JLCPCB Basic Part: No; JLCPCB Part Number: C342991; Supplier 1: LCSC; Category: Capacitors - MLCC; Supplier Part Number 1: C342991; Tolerance: ±10%; Voltage Rating: 16V; Temperature Coefficient: X6S; RoHS: Yes; ComponentLink1Description: Datasheet; ComponentLink1URL: https://wmsc.lcsc.com/wmsc/upload/file/pdf/v2/lcsc/2304140030_TDK-C1005X6S1C225KT000E_C342991.pdf; ComponentLink2Description: JLCPCB Part URL; ComponentLink2URL: https://jlcpcb.com/partdetail/C342991; ComponentLink3Description: LCSC Part URL; ComponentLink3URL: https://lcsc.com/product-detail/Multilayer-Ceramic-Capacitors-MLCC---SMD-SMT_TDK-TDK-C1005X6S1C225KT000E_C342991.html
footprint CAP-0402 (0402 (1005M) Capacitor)
pins: 1, 2

## C1005X7R1C103KT000F
designator C?  Capacitance: 10nF  (hidden comment: *)
Capacitor, Ceramic (MLCC), 10nF, ±10%, 16V, X7R, ±10%, SMD 0402; Manufacturer: TDK; Manufacturer Part Number: C1005X7R1C103KT000F; Package Size: 0402; JLCPCB Basic Part: No; JLCPCB Part Number: C361206; Supplier 1: LCSC; Category: Capacitors - MLCC; Supplier Part Number 1: C361206; Tolerance: ±10%; Voltage Rating: 16V; Temperature Coefficient: X7R; RoHS: Yes; ComponentLink1Description: Datasheet; ComponentLink1URL: https://wmsc.lcsc.com/wmsc/upload/file/pdf/v2/lcsc/2304140030_TDK-C1005X7R1C103KT000F_C361206.pdf; ComponentLink2Description: JLCPCB Part URL; ComponentLink2URL: https://jlcpcb.com/partdetail/C361206; ComponentLink3Description: LCSC Part URL; ComponentLink3URL: https://lcsc.com/product-detail/Multilayer-Ceramic-Capacitors-MLCC---SMD-SMT_TDK-TDK-C1005X7R1C103KT000F_C361206.html
footprint CAP-0402 (0402 (1005M) Capacitor)
pins: 1, 2

## C1005X7R1C104KT000F
designator C?  Capacitance: 100nF  (hidden comment: *)
Capacitor, Ceramic (MLCC), 100nF, ±10%, 16V, X7R, ±10%, SMD 0402; Manufacturer: TDK; Manufacturer Part Number: C1005X7R1C104KT000F; Package Size: 0402; JLCPCB Basic Part: No; JLCPCB Part Number: C338032; Supplier 1: LCSC; Category: Capacitors - MLCC; Supplier Part Number 1: C338032; Tolerance: ±10%; Voltage Rating: 16V; Temperature Coefficient: X7R; RoHS: Yes; ComponentLink1Description: Datasheet; ComponentLink1URL: https://wmsc.lcsc.com/wmsc/upload/file/pdf/v2/lcsc/2304140030_TDK-C1005X7R1C104KT000F_C338032.pdf; ComponentLink2Description: JLCPCB Part URL; ComponentLink2URL: https://jlcpcb.com/partdetail/C338032; ComponentLink3Description: LCSC Part URL; ComponentLink3URL: https://lcsc.com/product-detail/Multilayer-Ceramic-Capacitors-MLCC---SMD-SMT_TDK-TDK-C1005X7R1C104KT000F_C338032.html
footprint CAP-0402 (0402 (1005M) Capacitor)
pins: 1, 2

## C1005X7R1C224KT000E
designator C?  Capacitance: 220nF  (hidden comment: *)
Capacitor, Ceramic (MLCC), 220nF, ±10%, 16V, X7R, ±10%, SMD 0402; Manufacturer: TDK; Manufacturer Part Number: C1005X7R1C224KT000E; Package Size: 0402; JLCPCB Basic Part: No; JLCPCB Part Number: C432916; Supplier 1: LCSC; Category: Capacitors - MLCC; Supplier Part Number 1: C432916; Tolerance: ±10%; Voltage Rating: 16V; Temperature Coefficient: X7R; RoHS: Yes; ComponentLink1Description: Datasheet; ComponentLink1URL: https://wmsc.lcsc.com/wmsc/upload/file/pdf/v2/lcsc/2304140030_TDK-C1005X7R1C224KT000E_C432916.pdf; ComponentLink2Description: JLCPCB Part URL; ComponentLink2URL: https://jlcpcb.com/partdetail/C432916; ComponentLink3Description: LCSC Part URL; ComponentLink3URL: https://lcsc.com/product-detail/Multilayer-Ceramic-Capacitors-MLCC---SMD-SMT_TDK-TDK-C1005X7R1C224KT000E_C432916.html
footprint CAP-0402 (0402 (1005M) Capacitor)
pins: 1, 2

## C1005X7R1C273KT000F
designator C?  Capacitance: 27nF  (hidden comment: *)
Capacitor, Ceramic (MLCC), 27nF, ±10%, 16V, X7R, ±10%, SMD 0402; Manufacturer: TDK; Manufacturer Part Number: C1005X7R1C273KT000F; Package Size: 0402; JLCPCB Basic Part: No; JLCPCB Part Number: C338012; Supplier 1: LCSC; Category: Capacitors - MLCC; Supplier Part Number 1: C338012; Tolerance: ±10%; Voltage Rating: 16V; Temperature Coefficient: X7R; RoHS: Yes; ComponentLink1Description: Datasheet; ComponentLink1URL: https://wmsc.lcsc.com/wmsc/upload/file/pdf/v2/lcsc/2304140030_TDK-C1005X7R1C273KT000F_C338012.pdf; ComponentLink2Description: JLCPCB Part URL; ComponentLink2URL: https://jlcpcb.com/partdetail/C338012; ComponentLink3Description: LCSC Part URL; ComponentLink3URL: https://lcsc.com/product-detail/Multilayer-Ceramic-Capacitors-MLCC---SMD-SMT_TDK-TDK-C1005X7R1C273KT000F_C338012.html
footprint CAP-0402 (0402 (1005M) Capacitor)
pins: 1, 2

## C1005X7R1C473KT000F
designator C?  Capacitance: 47nF  (hidden comment: *)
Capacitor, Ceramic (MLCC), 47nF, ±10%, 16V, X7R, ±10%, SMD 0402; Manufacturer: TDK; Manufacturer Part Number: C1005X7R1C473KT000F; Package Size: 0402; JLCPCB Basic Part: No; JLCPCB Part Number: C338033; Supplier 1: LCSC; Category: Capacitors - MLCC; Supplier Part Number 1: C338033; Tolerance: ±10%; Voltage Rating: 16V; Temperature Coefficient: X7R; RoHS: Yes; ComponentLink1Description: Datasheet; ComponentLink1URL: https://wmsc.lcsc.com/wmsc/upload/file/pdf/v2/lcsc/2304140030_TDK-C1005X7R1C473KT000F_C338033.pdf; ComponentLink2Description: JLCPCB Part URL; ComponentLink2URL: https://jlcpcb.com/partdetail/C338033; ComponentLink3Description: LCSC Part URL; ComponentLink3URL: https://lcsc.com/product-detail/Multilayer-Ceramic-Capacitors-MLCC---SMD-SMT_TDK-TDK-C1005X7R1C473KT000F_C338033.html
footprint CAP-0402 (0402 (1005M) Capacitor)
pins: 1, 2

## C1005X7R1E103K050BB
designator C?  Capacitance: 10nF  (hidden comment: *)
Capacitor, Ceramic (MLCC), 10nF, ±10%, 25V, X7R, ±10%, SMD 0402; Manufacturer: TDK; Manufacturer Part Number: C1005X7R1E103K050BB; Package Size: 0402; JLCPCB Basic Part: No; JLCPCB Part Number: C2168390; Supplier 1: LCSC; Category: Capacitors - MLCC; Supplier Part Number 1: C2168390; Tolerance: ±10%; Voltage Rating: 25V; Temperature Coefficient: X7R; RoHS: Yes; ComponentLink1Description: Datasheet; ComponentLink1URL: https://wmsc.lcsc.com/wmsc/upload/file/pdf/v2/lcsc/2304140030_TDK-C1005X7R1E103K050BB_C2168390.pdf; ComponentLink2Description: JLCPCB Part URL; ComponentLink2URL: https://jlcpcb.com/partdetail/C2168390; ComponentLink3Description: LCSC Part URL; ComponentLink3URL: https://lcsc.com/product-detail/Multilayer-Ceramic-Capacitors-MLCC---SMD-SMT_TDK-TDK-C1005X7R1E103K050BB_C2168390.html
footprint CAP-0402 (0402 (1005M) Capacitor)
pins: 1, 2

## C1005X7R1E103KT000F
designator C?  Capacitance: 10nF  (hidden comment: *)
Capacitor, Ceramic (MLCC), 10nF, ±10%, 25V, X7R, ±10%, SMD 0402; Manufacturer: TDK; Manufacturer Part Number: C1005X7R1E103KT000F; Package Size: 0402; JLCPCB Basic Part: No; JLCPCB Part Number: C524922; Supplier 1: LCSC; Category: Capacitors - MLCC; Supplier Part Number 1: C524922; Tolerance: ±10%; Voltage Rating: 25V; Temperature Coefficient: X7R; RoHS: Yes; ComponentLink1Description: Datasheet; ComponentLink1URL: https://wmsc.lcsc.com/wmsc/upload/file/pdf/v2/lcsc/2007101533_TDK-C1005X7R1E103KT000F_C524922.pdf; ComponentLink2Description: JLCPCB Part URL; ComponentLink2URL: https://jlcpcb.com/partdetail/C524922; ComponentLink3Description: LCSC Part URL; ComponentLink3URL: https://lcsc.com/product-detail/Multilayer-Ceramic-Capacitors-MLCC---SMD-SMT_TDK-TDK-C1005X7R1E103KT000F_C524922.html
footprint CAP-0402 (0402 (1005M) Capacitor)
pins: 1, 2

## C1005X7R1E104KT000F
designator C?  Capacitance: 100nF  (hidden comment: *)
Capacitor, Ceramic (MLCC), 100nF, ±10%, 25V, X7R, ±10%, SMD 0402; Manufacturer: TDK; Manufacturer Part Number: C1005X7R1E104KT000F; Package Size: 0402; JLCPCB Basic Part: No; JLCPCB Part Number: C189396; Supplier 1: LCSC; Category: Capacitors - MLCC; Supplier Part Number 1: C189396; Tolerance: ±10%; Voltage Rating: 25V; Temperature Coefficient: X7R; RoHS: Yes; ComponentLink1Description: Datasheet; ComponentLink1URL: https://wmsc.lcsc.com/wmsc/upload/file/pdf/v2/lcsc/2304140030_TDK-C1005X7R1E104KT000F_C189396.pdf; ComponentLink2Description: JLCPCB Part URL; ComponentLink2URL: https://jlcpcb.com/partdetail/C189396; ComponentLink3Description: LCSC Part URL; ComponentLink3URL: https://lcsc.com/product-detail/Multilayer-Ceramic-Capacitors-MLCC---SMD-SMT_TDK-TDK-C1005X7R1E104KT000F_C189396.html
footprint CAP-0402 (0402 (1005M) Capacitor)
pins: 1, 2

## C1005X7R1E223KT000F
designator C?  Capacitance: 22nF  (hidden comment: *)
Capacitor, Ceramic (MLCC), 22nF, ±10%, 25V, X7R, ±10%, SMD 0402; Manufacturer: TDK; Manufacturer Part Number: C1005X7R1E223KT000F; Package Size: 0402; JLCPCB Basic Part: No; JLCPCB Part Number: C191902; Supplier 1: LCSC; Category: Capacitors - MLCC; Supplier Part Number 1: C191902; Tolerance: ±10%; Voltage Rating: 25V; Temperature Coefficient: X7R; RoHS: Yes; ComponentLink1Description: Datasheet; ComponentLink1URL: https://wmsc.lcsc.com/wmsc/upload/file/pdf/v2/lcsc/2304140030_TDK-C1005X7R1E223KT000F_C191902.pdf; ComponentLink2Description: JLCPCB Part URL; ComponentLink2URL: https://jlcpcb.com/partdetail/C191902; ComponentLink3Description: LCSC Part URL; ComponentLink3URL: https://lcsc.com/product-detail/Multilayer-Ceramic-Capacitors-MLCC---SMD-SMT_TDK-TDK-C1005X7R1E223KT000F_C191902.html
footprint CAP-0402 (0402 (1005M) Capacitor)
pins: 1, 2